# Altium footprint library Molex.PcbLib: 45 footprints (part 1 of 3)
Each footprint in its own frame and in the unit in brackets; x right, y up, seen from the top. Pads: shape width x height; smd on the part's side, far side on the other; paste and mask are expansions set on the pad; w line width, h text height; cw(c..) or ccw(c..) is an arc to the next point about the centre after c.
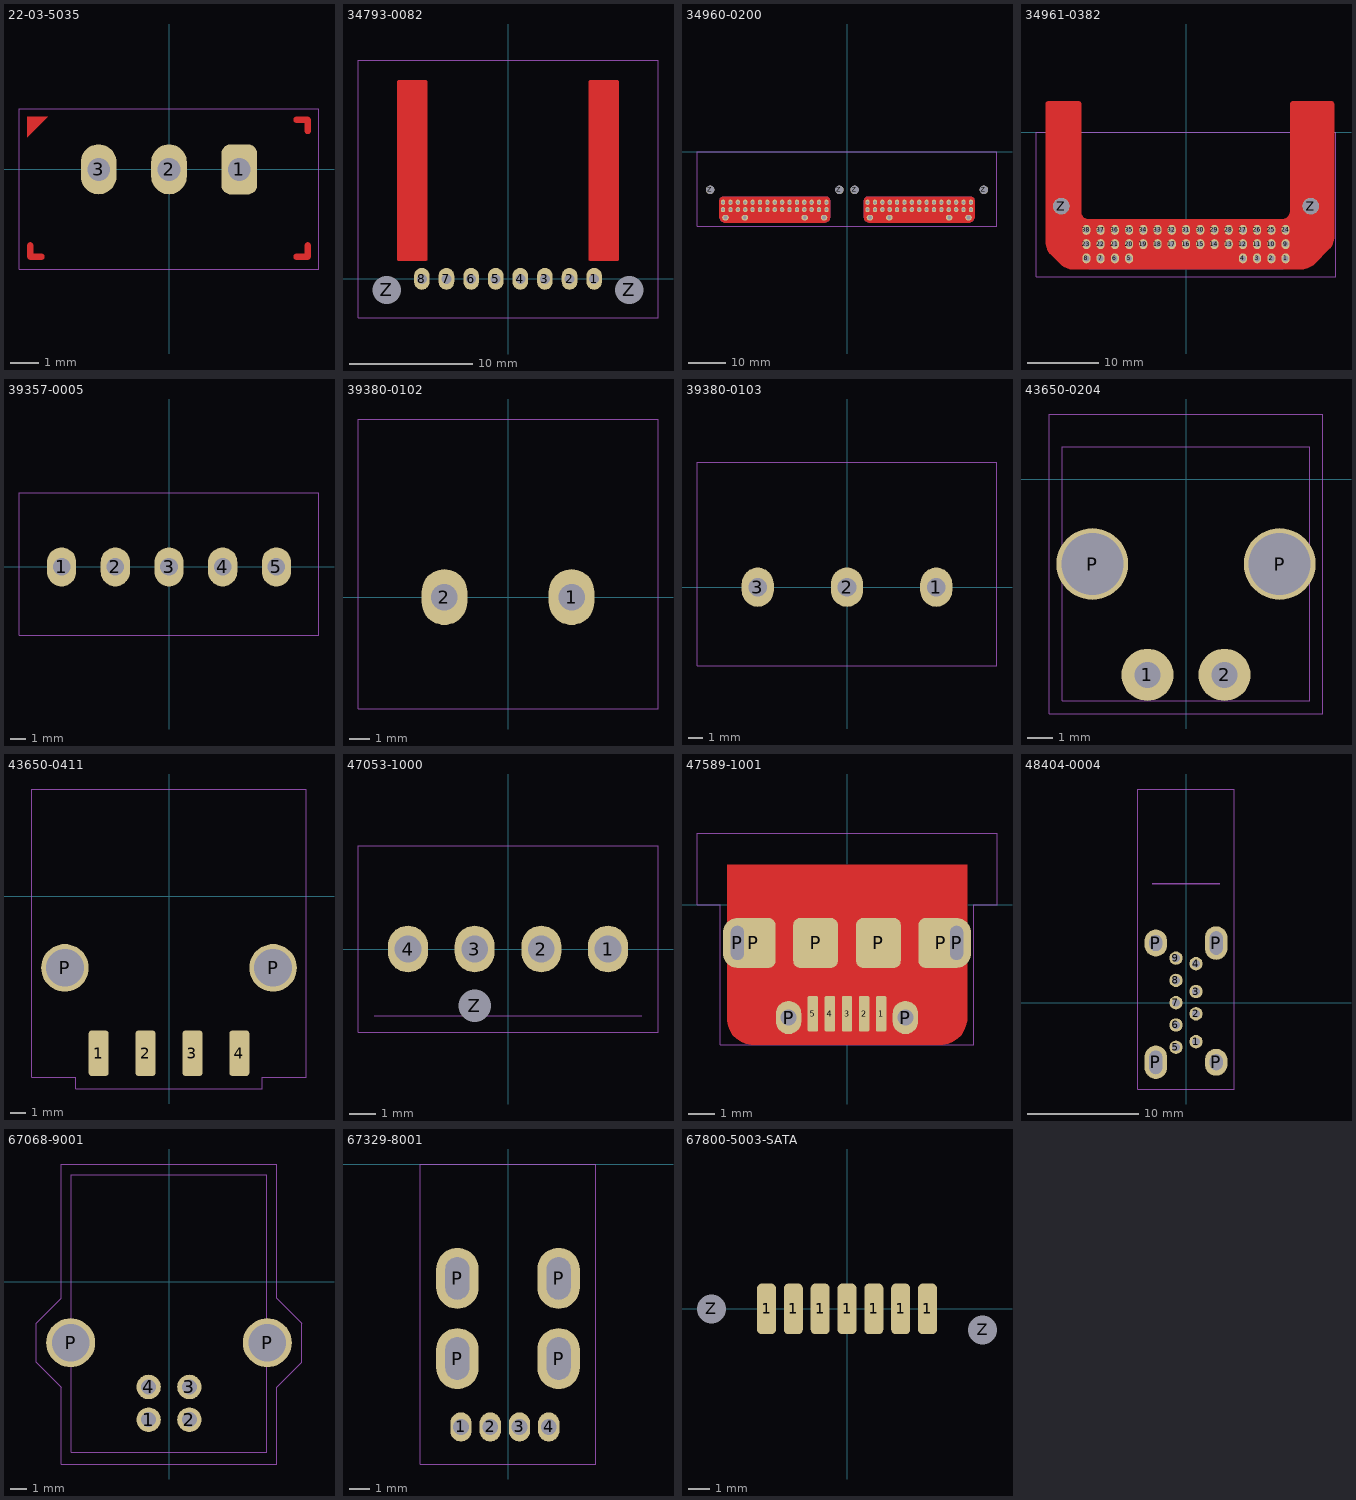
[diagram p0: the footprints below, top view; thin cyan lines are the x and y axes]

## 22-03-5035 [mil] "Mini-SPOX Wire-to-Board Connector"
pads (3):
  rrect50% 50x70 hole 32: 1(98.43,0)
  oval 50x70 hole 32: 2(0,0) 3(-98.43,0)
Top Layer:
  region: 190.36,53.55 190.36,52.76 190.97,51.28 192.09,50.16 193.56,49.55 194.36,49.55 195.15,49.55 196.62,50.16 197.75,51.28 198.36,52.76 198.36,53.55 198.36,69.55 198.36,70.35 197.75,71.82 196.62,72.94 195.15,73.55 194.36,73.55 178.36,73.55 177.56,73.55 176.09,72.94 174.97,71.82 174.36,70.35 174.36,69.55 174.36,68.76 174.97,67.28 176.09,66.16 177.56,65.55 178.36,65.55 188.36,65.55 188.75,65.51 189.47,65.21 190.02,64.66 190.32,63.94 190.36,63.55
  region: 178.36,-118.29 177.56,-118.29 176.09,-118.9 174.97,-120.03 174.36,-121.5 174.36,-122.29 174.36,-123.09 174.97,-124.56 176.09,-125.68 177.56,-126.29 178.36,-126.29 194.36,-126.29 195.15,-126.29 196.62,-125.68 197.75,-124.56 198.36,-123.09 198.36,-122.29 198.36,-106.29 198.36,-105.5 197.75,-104.03 196.62,-102.9 195.15,-102.29 194.36,-102.29 193.56,-102.29 192.09,-102.9 190.97,-104.03 190.36,-105.5 190.36,-106.29 190.36,-116.29 190.32,-116.68 190.02,-117.4 189.47,-117.96 188.75,-118.26 188.36,-118.29
  region: -198.34,73.55 -198.34,45.01 -169.79,73.55
  region: -190.34,-106.29 -190.34,-105.5 -190.95,-104.03 -192.07,-102.9 -193.54,-102.29 -194.34,-102.29 -195.13,-102.29 -196.6,-102.9 -197.73,-104.03 -198.34,-105.5 -198.34,-106.29 -198.34,-122.29 -198.34,-123.09 -197.73,-124.56 -196.6,-125.68 -195.13,-126.29 -194.34,-126.29 -178.34,-126.29 -177.54,-126.29 -176.07,-125.68 -174.95,-124.56 -174.34,-123.09 -174.34,-122.29 -174.34,-121.5 -174.95,-120.03 -176.07,-118.9 -177.54,-118.29 -178.34,-118.29 -188.34,-118.29 -188.73,-118.26 -189.45,-117.96 -190,-117.4 -190.3,-116.68 -190.34,-116.29
Top Component Outline:
  lines w1: -210,-140 -210,85 210,85 210,-140 -210,-140
3D body "MOLEX-22-03-5035.stp": height 232.14, standoff -137.94, extent -194.87,-122.83 194.89,70.09

## 34793-0082 [mil]
pads (10):
  oval 50x70 hole 32: 1(275.59,0) 2(196.85,0) 3(118.11,0) 4(39.37,0) 5(-39.37,0) 6(-118.11,0) 7(-196.85,0) 8(-275.59,0)
  round 85.55 hole 90.55 unplated mask+8: Z(-387.8,-35.43) Z(387.8,-35.43)
Top Layer:
  pour cut-out: 263.39,57.99 350,57.99 350.99,57.99 352.83,58.75 354.24,60.16 355,62 355,62.99 355,629.92 355,630.92 354.24,632.75 352.83,634.16 350.99,634.92 350,634.92 263.39,634.92 262.39,634.92 260.55,634.16 259.15,632.75 258.39,630.92 258.39,629.92 258.39,62.99 258.39,62 259.15,60.16 260.55,58.75 262.39,57.99
  pour cut-out: -350,57.99 -263.39,57.99 -262.39,57.99 -260.55,58.75 -259.15,60.16 -258.39,62 -258.39,62.99 -258.39,629.92 -258.39,630.92 -259.15,632.75 -260.55,634.16 -262.39,634.92 -263.39,634.92 -350,634.92 -350.99,634.92 -352.83,634.16 -354.24,632.75 -355,630.92 -355,629.92 -355,62.99 -355,62 -354.24,60.16 -352.83,58.75 -350.99,57.99
Top Solder:
  region: -263.39,629.92 -350,629.92 -350,62.99 -263.39,62.99
  region: 350,629.92 263.39,629.92 263.39,62.99 350,62.99
Top Component Outline:
  lines w1: -480,-125 480,-125 480,700 -480,700 -480,-125
Top 3D Body (Mech16):
  lines w1: -350,62.99 -263.39,62.99 -263.39,629.92 -350,629.92 -350,62.99 ; 263.39,62.99 350,62.99 350,629.92 263.39,629.92 263.39,62.99
Multi-Layer:
  pour cut-out: 387.8,-95.43 381.89,-95.43 370.29,-93.13 359.37,-88.6 349.55,-82.04 341.19,-73.68 334.62,-63.85 330.1,-52.93 327.8,-41.34 327.8,-35.43 327.8,-29.52 330.1,-17.93 334.62,-7.01 341.19,2.81 349.55,11.17 359.37,17.74 370.29,22.26 381.89,24.57 387.8,24.57 393.7,24.57 405.3,22.26 416.22,17.74 426.04,11.17 434.4,2.81 440.97,-7.01 445.49,-17.93 447.8,-29.52 447.8,-35.43 447.8,-41.34 445.49,-52.93 440.97,-63.85 434.4,-73.68 426.04,-82.04 416.22,-88.6 405.3,-93.13 393.7,-95.43
  pour cut-out: -387.8,-95.43 -381.89,-95.43 -370.29,-93.13 -359.37,-88.6 -349.55,-82.04 -341.19,-73.68 -334.62,-63.85 -330.1,-52.93 -327.8,-41.34 -327.8,-35.43 -327.8,-29.52 -330.1,-17.93 -334.62,-7.01 -341.19,2.81 -349.55,11.17 -359.37,17.74 -370.29,22.26 -381.89,24.57 -387.8,24.57 -393.7,24.57 -405.3,22.26 -416.22,17.74 -426.04,11.17 -434.4,2.81 -440.97,-7.01 -445.49,-17.93 -447.8,-29.52 -447.8,-35.43 -447.8,-41.34 -445.49,-52.93 -440.97,-63.85 -434.4,-73.68 -426.04,-82.04 -416.22,-88.6 -405.3,-93.13 -393.7,-95.43
3D body "347930082.stp": height 411.95, standoff -145.19, extent -445.3,-90.55 445.3,610.24

## 34960-0200 [mil]
pads (72):
  oval 70x60 hole 40: A1(1296.06,-704.72) A2(1089.37,-704.72) A3(451.57,-704.72) A4(244.88,-704.72) B1(-244.88,-704.72) B2(-451.57,-704.72) B3(-1089.37,-704.72) B4(-1296.06,-704.72)
  oval 45x55 hole 32: A5(1321.65,-620.08) A6(1242.91,-620.08) A7(1164.17,-620.08) A8(1085.43,-620.08) A9(1006.69,-620.08) A10(927.95,-620.08) A11(849.21,-620.08) A12(770.47,-620.08) A13(691.73,-620.08) A14(612.99,-620.08) A15(534.25,-620.08) A16(455.51,-620.08) A17(376.77,-620.08) A18(298.03,-620.08) A19(219.29,-620.08) A20(1321.65,-541.34) A21(1242.91,-541.34) A22(1164.17,-541.34) A23(1085.43,-541.34) A24(1006.69,-541.34) A25(927.95,-541.34) A26(849.21,-541.34) A27(770.47,-541.34) A28(691.73,-541.34) A29(612.99,-541.34) A30(534.25,-541.34) A31(455.51,-541.34) A32(376.77,-541.34) A33(298.03,-541.34) A34(219.29,-541.34) B5(-219.29,-620.08) B6(-298.03,-620.08) B7(-376.77,-620.08) B8(-455.51,-620.08) B9(-534.25,-620.08) B10(-612.99,-620.08) B11(-691.73,-620.08) B12(-770.47,-620.08) B13(-849.21,-620.08) B14(-927.95,-620.08) B15(-1006.69,-620.08) B16(-1085.43,-620.08) B17(-1164.17,-620.08) B18(-1242.91,-620.08) B19(-1321.65,-620.08) B20(-219.29,-541.34) B21(-298.03,-541.34) B22(-376.77,-541.34) B23(-455.51,-541.34) B24(-534.25,-541.34) B25(-612.99,-541.34) B26(-691.73,-541.34) B27(-770.47,-541.34) B28(-849.21,-541.34) B29(-927.95,-541.34) B30(-1006.69,-541.34) B31(-1085.43,-541.34) B32(-1164.17,-541.34) B33(-1242.91,-541.34) B34(-1321.65,-541.34)
  round 90 hole 90.55 unplated mask+8: Z(-1460.63,-409.45) Z(-80.31,-409.45) Z(80.31,-409.45) Z(1460.63,-409.45)
Top Layer:
  pour cut-out: -179.92,-521.65 -179.92,-517.78 -181.43,-510.17 -184.4,-503 -188.71,-496.56 -194.19,-491.07 -200.64,-486.76 -207.81,-483.8 -215.41,-482.28 -219.29,-482.28 -1321.65,-482.28 -1325.53,-482.28 -1333.14,-483.8 -1340.3,-486.76 -1346.75,-491.07 -1352.23,-496.56 -1356.54,-503 -1359.51,-510.17 -1361.02,-517.78 -1361.02,-521.65 -1361.02,-698.82 -1361.02,-704.64 -1358.75,-716.04 -1354.3,-726.79 -1347.84,-736.46 -1339.61,-744.69 -1329.94,-751.15 -1319.19,-755.6 -1307.79,-757.87 -1301.97,-757.87 -238.98,-757.87 -233.16,-757.87 -221.75,-755.6 -211,-751.15 -201.33,-744.69 -193.11,-736.46 -186.64,-726.79 -182.19,-716.04 -179.92,-704.64 -179.92,-698.82
  pour cut-out: 1361.02,-521.65 1361.02,-517.78 1359.51,-510.17 1356.54,-503 1352.23,-496.56 1346.75,-491.07 1340.3,-486.76 1333.14,-483.8 1325.53,-482.28 1321.65,-482.28 219.29,-482.28 215.41,-482.28 207.81,-483.8 200.64,-486.76 194.19,-491.07 188.71,-496.56 184.4,-503 181.43,-510.17 179.92,-517.78 179.92,-521.65 179.92,-698.82 179.92,-704.64 182.19,-716.04 186.64,-726.79 193.11,-736.46 201.33,-744.69 211,-751.15 221.75,-755.6 233.16,-757.87 238.98,-757.87 1301.97,-757.87 1307.79,-757.87 1319.19,-755.6 1329.94,-751.15 1339.61,-744.69 1347.84,-736.46 1354.3,-726.79 1358.75,-716.04 1361.02,-704.64 1361.02,-698.82
Bottom Layer:
  pour cut-out: -1361.02,-521.65 -1361.02,-517.78 -1359.51,-510.17 -1356.54,-503 -1352.23,-496.56 -1346.75,-491.07 -1340.3,-486.76 -1333.14,-483.8 -1325.53,-482.28 -1321.65,-482.28 -219.29,-482.28 -215.41,-482.28 -207.81,-483.8 -200.64,-486.76 -194.19,-491.07 -188.71,-496.56 -184.4,-503 -181.43,-510.17 -179.92,-517.78 -179.92,-521.65 -179.92,-698.82 -179.92,-704.64 -182.19,-716.04 -186.64,-726.79 -193.11,-736.46 -201.33,-744.69 -211,-751.15 -221.75,-755.6 -233.16,-757.87 -238.98,-757.87 -1301.97,-757.87 -1307.79,-757.87 -1319.19,-755.6 -1329.94,-751.15 -1339.61,-744.69 -1347.84,-736.46 -1354.3,-726.79 -1358.75,-716.04 -1361.02,-704.64 -1361.02,-698.82
  pour cut-out: 179.92,-521.65 179.92,-517.78 181.43,-510.17 184.4,-503 188.71,-496.56 194.19,-491.07 200.64,-486.76 207.81,-483.8 215.41,-482.28 219.29,-482.28 1321.65,-482.28 1325.53,-482.28 1333.14,-483.8 1340.3,-486.76 1346.75,-491.07 1352.23,-496.56 1356.54,-503 1359.51,-510.17 1361.02,-517.78 1361.02,-521.65 1361.02,-698.82 1361.02,-704.64 1358.75,-716.04 1354.3,-726.79 1347.84,-736.46 1339.61,-744.69 1329.94,-751.15 1319.19,-755.6 1307.79,-757.87 1301.97,-757.87 238.98,-757.87 233.16,-757.87 221.75,-755.6 211,-751.15 201.33,-744.69 193.11,-736.46 186.64,-726.79 182.19,-716.04 179.92,-704.64 179.92,-698.82
Top Component Outline:
  lines w1: -1600,-800 -1600,0 1600,0 1600,-800 -1600,-800
Top 3D Body (Mech16):
  lines w1: -1563.95,0 1563.95,0
Multi-Layer:
  pour cut-out: -1460.63,-469.45 -1466.54,-469.45 -1478.13,-467.14 -1489.05,-462.62 -1498.88,-456.05 -1507.23,-447.7 -1513.8,-437.87 -1518.32,-426.95 -1520.63,-415.36 -1520.63,-409.45 -1520.63,-403.54 -1518.32,-391.95 -1513.8,-381.03 -1507.23,-371.2 -1498.88,-362.84 -1489.05,-356.28 -1478.13,-351.75 -1466.54,-349.45 -1460.63,-349.45 -1454.72,-349.45 -1443.13,-351.75 -1432.21,-356.28 -1422.38,-362.84 -1414.02,-371.2 -1407.46,-381.03 -1402.94,-391.95 -1400.63,-403.54 -1400.63,-409.45 -1400.63,-415.36 -1402.94,-426.95 -1407.46,-437.87 -1414.02,-447.7 -1422.38,-456.05 -1432.21,-462.62 -1443.13,-467.14 -1454.72,-469.45
  pour cut-out: -80.31,-469.45 -86.22,-469.45 -97.82,-467.14 -108.74,-462.62 -118.56,-456.05 -126.92,-447.7 -133.49,-437.87 -138.01,-426.95 -140.31,-415.36 -140.31,-409.45 -140.31,-403.54 -138.01,-391.95 -133.49,-381.03 -126.92,-371.2 -118.56,-362.84 -108.74,-356.28 -97.82,-351.75 -86.22,-349.45 -80.31,-349.45 -74.41,-349.45 -62.81,-351.75 -51.89,-356.28 -42.07,-362.84 -33.71,-371.2 -27.14,-381.03 -22.62,-391.95 -20.31,-403.54 -20.31,-409.45 -20.31,-415.36 -22.62,-426.95 -27.14,-437.87 -33.71,-447.7 -42.07,-456.05 -51.89,-462.62 -62.81,-467.14 -74.41,-469.45
  pour cut-out: 80.31,-469.45 74.41,-469.45 62.81,-467.14 51.89,-462.62 42.07,-456.05 33.71,-447.7 27.14,-437.87 22.62,-426.95 20.32,-415.36 20.32,-409.45 20.32,-403.54 22.62,-391.95 27.14,-381.03 33.71,-371.2 42.07,-362.84 51.89,-356.28 62.81,-351.75 74.41,-349.45 80.31,-349.45 86.22,-349.45 97.82,-351.75 108.74,-356.28 118.56,-362.84 126.92,-371.2 133.49,-381.03 138.01,-391.95 140.31,-403.54 140.31,-409.45 140.31,-415.36 138.01,-426.95 133.49,-437.87 126.92,-447.7 118.56,-456.05 108.74,-462.62 97.82,-467.14 86.22,-469.45
  pour cut-out: 1460.63,-469.45 1466.54,-469.45 1478.13,-467.14 1489.05,-462.62 1498.88,-456.05 1507.23,-447.7 1513.8,-437.87 1518.32,-426.95 1520.63,-415.36 1520.63,-409.45 1520.63,-403.54 1518.32,-391.95 1513.8,-381.03 1507.23,-371.2 1498.88,-362.84 1489.05,-356.28 1478.13,-351.75 1466.54,-349.45 1460.63,-349.45 1454.72,-349.45 1443.13,-351.75 1432.21,-356.28 1422.38,-362.84 1414.02,-371.2 1407.46,-381.03 1402.94,-391.95 1400.63,-403.54 1400.63,-409.45 1400.63,-415.36 1402.94,-426.95 1407.46,-437.87 1414.02,-447.7 1422.38,-456.05 1432.21,-462.62 1443.13,-467.14 1454.72,-469.45
3D body "MOLEX-34960-0200.stp": height 658.02, standoff -146.32, extent -1563.94,-763.95 1563.95,157.48

## 34961-0382 [mil]
pads (40):
  oval 45x55 hole 32: 1(551.18,-698.82) 2(472.44,-698.82) 3(393.7,-698.82) 4(314.96,-698.82) 5(-314.96,-698.82) 6(-393.7,-698.82) 7(-472.44,-698.82) 8(-551.18,-698.82) 9(551.18,-620.08) 10(472.44,-620.08) 11(393.7,-620.08) 12(314.96,-620.08) 13(236.22,-620.08) 14(157.48,-620.08) 15(78.74,-620.08) 16(0,-620.08) 17(-78.74,-620.08) 18(-157.48,-620.08) 19(-236.22,-620.08) 20(-314.96,-620.08) 21(-393.7,-620.08) 22(-472.44,-620.08) 23(-551.18,-620.08) 24(551.18,-541.34) 25(472.44,-541.34) 26(393.7,-541.34) 27(314.96,-541.34) 28(236.22,-541.34) 29(157.48,-541.34) 30(78.74,-541.34) 31(0,-541.34) 32(-78.74,-541.34) 33(-157.48,-541.34) 34(-236.22,-541.34) 35(-314.96,-541.34) 36(-393.7,-541.34) 37(-472.44,-541.34) 38(-551.18,-541.34)
  round 90 hole 90.55 unplated mask+8: Z(-690.16,-409.45) Z(690.16,-409.45)
Top Layer:
  pour cut-out: 530,-482.28 534.52,-482.06 543.4,-480.3 551.76,-476.83 559.28,-471.81 565.68,-465.41 570.71,-457.88 574.17,-449.52 575.93,-440.65 576.16,-436.13 576.16,155.61 576.16,158.47 578.35,163.76 582.4,167.81 587.69,170 590.55,170 805,170 807.98,170 813.5,167.72 817.72,163.5 820,157.98 820,155 820,-578.74 820,-588.59 816.16,-607.91 808.62,-626.1 797.67,-642.48 790.71,-649.45 711.57,-728.58 704.61,-735.55 688.23,-746.49 670.03,-754.03 650.71,-757.87 640.86,-757.87 -634.2,-757.87 -642.03,-757.87 -657.39,-754.82 -671.85,-748.83 -684.87,-740.13 -690.41,-734.59 -745.71,-679.29 -752.68,-672.32 -763.62,-655.95 -771.16,-637.75 -775,-618.43 -775,-608.58 -775,158.7 -775,160.95 -773.28,165.1 -770.1,168.28 -765.95,170 -763.7,170 -592.52,170 -590.03,170 -585.43,168.09 -581.91,164.57 -580,159.97 -580,157.48 -580,-442.28 -579.81,-446.2 -578.28,-453.89 -575.28,-461.14 -570.92,-467.66 -565.38,-473.2 -558.86,-477.56 -551.61,-480.56 -543.92,-482.09 -540,-482.28
  pour cut-out: 551.18,-482.28
Bottom Layer:
  pour cut-out: -590.55,-521.65 -590.55,-517.78 -589.04,-510.17 -586.07,-503 -581.76,-496.56 -576.28,-491.07 -569.83,-486.76 -562.66,-483.8 -555.06,-482.28 -551.18,-482.28 551.18,-482.28 555.06,-482.28 562.66,-483.8 569.83,-486.76 576.28,-491.07 581.76,-496.56 586.07,-503 589.04,-510.17 590.55,-517.78 590.55,-521.65 590.55,-698.82 590.55,-704.64 588.28,-716.04 583.83,-726.79 577.37,-736.46 569.14,-744.69 559.47,-751.15 548.72,-755.6 537.31,-757.87 531.5,-757.87 -531.5,-757.87 -537.31,-757.87 -548.72,-755.6 -559.47,-751.15 -569.14,-744.69 -577.37,-736.46 -583.83,-726.79 -588.28,-716.04 -590.55,-704.64 -590.55,-698.82
Top Solder:
  region: 595,150 595,-720 643.58,-720 653.43,-720 672.75,-716.16 690.95,-708.62 707.32,-697.68 714.29,-690.71 770.71,-634.29 777.67,-627.32 788.62,-610.95 796.16,-592.75 800,-573.43 800,-563.58 800,150
  pour cut-out: 800,150
  region: -595,150 -760,150 -760,-603.58 -760,-613.43 -756.16,-632.75 -748.62,-650.95 -737.68,-667.32 -730.71,-674.29 -714.29,-690.71 -707.32,-697.68 -690.95,-708.62 -672.75,-716.16 -653.43,-720 -643.58,-720 -595,-720
Top Component Outline:
  pour cut-out: 780,-679.13
  lines w1: 829.53,0 -830,0 -830,-800 830,-800 830,0
Multi-Layer:
  pour cut-out: -690.16,-469.45 -696.07,-469.45 -707.66,-467.14 -718.58,-462.62 -728.41,-456.05 -736.76,-447.7 -743.33,-437.87 -747.85,-426.95 -750.16,-415.36 -750.16,-409.45 -750.16,-403.54 -747.85,-391.95 -743.33,-381.03 -736.76,-371.2 -728.41,-362.84 -718.58,-356.28 -707.66,-351.75 -696.07,-349.45 -690.16,-349.45 -684.25,-349.45 -672.66,-351.75 -661.74,-356.28 -651.91,-362.84 -643.55,-371.2 -636.99,-381.03 -632.46,-391.95 -630.16,-403.54 -630.16,-409.45 -630.16,-415.36 -632.46,-426.95 -636.99,-437.87 -643.55,-447.7 -651.91,-456.05 -661.74,-462.62 -672.66,-467.14 -684.25,-469.45
  pour cut-out: 690.16,-469.45 696.07,-469.45 707.66,-467.14 718.58,-462.62 728.41,-456.05 736.76,-447.7 743.33,-437.87 747.85,-426.95 750.16,-415.36 750.16,-409.45 750.16,-403.54 747.85,-391.95 743.33,-381.03 736.76,-371.2 728.41,-362.84 718.58,-356.28 707.66,-351.75 696.07,-349.45 690.16,-349.45 684.25,-349.45 672.66,-351.75 661.74,-356.28 651.91,-362.84 643.55,-371.2 636.99,-381.03 632.46,-391.95 630.16,-403.54 630.16,-409.45 630.16,-415.36 632.46,-426.95 636.99,-437.87 643.55,-447.7 651.91,-456.05 661.74,-462.62 672.66,-467.14 684.25,-469.45
3D body "MOLEX-34961-0382.stp": height 1143.71, standoff -614.92, extent -1016.71,-764 997.76,157.46

## 39357-0005 [mil]
pads (5):
  oval 75x100 hole 45: 1(-275.59,0) 2(-137.8,0) 3(0,0) 4(137.8,0) 5(275.59,0)
Top Component Outline:
  lines w1: -385,-175 385,-175 385,190 -385,190 -385,-175
3D body "MOLEX-39357-0005.stp": height 335, standoff -138, extent -344.99,-136 345,151

## 39380-0102 [mil]
pads (2):
  oval 90x110 hole 52: 1(125,0) 2(-125,0)
Top Component Outline:
  lines w1: -295,-220 -295,350 295,350 295,-220 -295,-220
3D body "MOLEX-39380-0102.stp": height 846, standoff -217, extent -274.01,-181 249.99,311

## 39380-0103 [mil]
pads (3):
  oval 90x110 hole 52: 1(250,0) 2(0,0) 3(-250,0)
Top Component Outline:
  lines w1: -420,-220 -420,350 420,350 420,-220 -420,-220
3D body "MOLEX-39380-0103.stp": height 846, standoff -217, extent -399.01,-181 374.99,311

## 43650-0204 [mil] "DC POWER JACK"
pads (4):
  round 80 hole 40: 1(-59.05,-300) 2(59.06,-300)
  round 110 hole 95: P(-143.7,-130) P(143.7,-130)
Top Component Outline:
  lines w1: -210,-360 -210,100 210,100 210,-360 -210,-360
Top 3D Body (Mech16):
  lines w1: -189.96,-339.77 189.96,-339.77 189.96,50 -189.96,50 -189.96,-339.77
3D body "436500204.stp": height 218.43, standoff -127.44, extent -189.96,-339.77 189.96,50

## 43650-0411 [mil]
pads (6):
  rrect30% 50x115 smd paste+0 mask+2: 1(-177.17,-395) 2(-59.05,-395) 3(59.06,-395) 4(177.17,-395)
  round 120 hole 95: P(-262,-180) P(262,-180)
Top Component Outline:
  lines w1: -345,-455 -345,270 345,270 345,-455 235,-455 235,-485 -235,-485 -235,-455 -345,-455
3D body "MOLEX-43650-0411.stp": height 223.43, standoff -75.98, extent -308.07,-421.84 308.07,1

## 47053-1000 [mm]
pads (5):
  oval 1.524x1.778 hole 1.02: 1(3.81,0) 2(1.27,0) 3(-1.27,0) 4(-3.81,0)
  round 1 hole 1.25 unplated: Z(-1.27,-2.16)
Top Component Outline:
  lines w0.025: -5.715,-3.175 5.715,-3.175 5.715,3.937 -5.715,3.937 -5.715,-3.175
Top 3D Body (Mech16):
  lines w0.025: -5.1,-2.54 5.1,-2.54
3D body "MOLEX-47053-1000.stp": height 10.04, standoff -3.46, extent -5.1,-2.54 5.1,3.3

## 47589-1001 [mm] "REC TYPE AB ASSY MICRO USB"
pads (13):
  rrect30% 0.4x1.35 smd: 1(1.3,-4.15) 2(0.65,-4.15) 3(0,-4.15) 4(-0.65,-4.15) 5(-1.3,-4.15)
  oval 1.1x1.9 hole 0.5 slot 1.3 at 90 deg: P(-4.175,-1.45) P(4.175,-1.45)
  rrect30% 1.7x1.9 smd paste+0: P(-3.575,-1.45)
  oval 0.965x1.27 hole 0.61: P(-2.222,-4.293) P(2.222,-4.293)
  rrect30% 1.7x1.9 smd: P(-1.2,-1.45) P(1.2,-1.45) P(3.575,-1.45)
Top Layer:
  pour cut-out: -4.572,1.524 -4.572,-4.318 -4.572,-4.418 -4.533,-4.614 -4.456,-4.799 -4.345,-4.966 -4.204,-5.107 -4.037,-5.218 -3.852,-5.295 -3.656,-5.334 -3.556,-5.334 3.556,-5.334 3.656,-5.334 3.852,-5.295 4.037,-5.218 4.204,-5.107 4.345,-4.966 4.456,-4.799 4.533,-4.614 4.572,-4.418 4.572,-4.318 4.572,1.524
Top Paste:
  region: 2.222,-3.658 2.298,-3.658 2.438,-3.716 2.545,-3.823 2.603,-3.963 2.603,-4.039 2.603,-4.547 2.603,-4.622 2.545,-4.762 2.438,-4.87 2.298,-4.928 2.222,-4.928 2.147,-4.928 2.007,-4.87 1.9,-4.762 1.842,-4.622 1.842,-4.547 1.842,-4.039 1.842,-3.963 1.9,-3.823 2.007,-3.716 2.147,-3.658
  region: -2.223,-3.658 -2.147,-3.658 -2.007,-3.716 -1.9,-3.823 -1.842,-3.963 -1.842,-4.039 -1.842,-4.547 -1.842,-4.622 -1.9,-4.762 -2.007,-4.87 -2.147,-4.928 -2.223,-4.928 -2.298,-4.928 -2.438,-4.87 -2.545,-4.762 -2.603,-4.622 -2.603,-4.547 -2.603,-4.039 -2.603,-3.963 -2.545,-3.823 -2.438,-3.716 -2.298,-3.658
  region: -4.175,-0.51 -4.281,-0.51 -4.477,-0.591 -4.627,-0.741 -4.708,-0.937 -4.708,-1.044 -4.708,-1.856 -4.708,-1.962 -4.627,-2.159 -4.477,-2.309 -4.281,-2.39 -4.175,-2.39 -4.069,-2.39 -3.873,-2.309 -3.723,-2.159 -3.642,-1.962 -3.642,-1.856 -3.642,-1.044 -3.642,-0.937 -3.723,-0.741 -3.873,-0.591 -4.069,-0.51
  region: 4.175,-0.51 4.069,-0.51 3.873,-0.591 3.723,-0.741 3.642,-0.937 3.642,-1.044 3.642,-1.856 3.642,-1.962 3.723,-2.159 3.873,-2.309 4.069,-2.39 4.175,-2.39 4.281,-2.39 4.477,-2.309 4.627,-2.159 4.708,-1.962 4.708,-1.856 4.708,-1.044 4.708,-0.937 4.627,-0.741 4.477,-0.591 4.281,-0.51
Top Component Outline:
  lines w0.025: -5.715,0 -5.715,2.732 5.715,2.732 5.715,0 4.826,0 4.826,-5.334 -4.826,-5.334 -4.826,0 -5.715,0
3D body "475891001.stp": height 2.72, standoff -0.62, extent -4.325,-4.496 4.325,1.299

## 48404-0004 [mm] "CONN RCPT USB 3.0 A UPRIGHT PCB"
pads (13):
  round 1.2 hole 0.7: 1(0.9,-3.5) 2(0.9,-1) 3(0.9,1) 4(0.9,3.5) 5(-0.9,-4) 6(-0.9,-2) 7(-0.9,0) 8(-0.9,2) 9(-0.9,4)
  oval 2.032x2.997 hole 1.143 slot 2.108 at 90 deg: P(-2.71,-5.35) P(2.71,5.35)
  oval 2.032x2.413 hole 1.143 slot 1.422 at 90 deg: P(-2.71,5.35) P(2.71,-5.35)
Top Component Outline:
  lines w0.025: -4.318,-7.747 -4.318,19.177 4.318,19.177 4.318,-7.747 -4.318,-7.747
Top 3D Body (Mech16):
  lines w0.127: -3.048,10.676 3.048,10.676
3D body "484040004.stp": height 14.64, standoff -3.56, extent -3.66,-7.142 3.66,18.558

## 67068-9001 [mm]
pads (6):
  round 1.5 hole 0.92: 1(-1.25,-8.46) 2(1.25,-8.46) 3(1.25,-6.46) 4(-1.25,-6.46)
  round 3 hole 2.3: P(-6.02,-3.75) P(6.02,-3.75)
Top Component Outline:
  lines w0.025: -8.128,-4.953 -6.604,-6.477 -6.604,-11.176 6.604,-11.176 6.604,-6.477 8.128,-4.953 8.128,-2.547 6.604,-1.023 6.604,7.196 -6.604,7.196 -6.604,-1.023 -8.128,-2.547 -8.128,-4.953
Top 3D Body (Mech16):
  lines w0.025: -6,-10.45 -6,6.55 6,6.55 6,-10.45 -6,-10.45
3D body "670689001.stp": height 12.05, standoff -3.17, extent -7.43,-10.45 7.43,6.55

## 67329-8001 [mil] "CONN RCPT USB 4POS UPRIGHT PCB"
pads (8):
  oval 40x55 hole 30: 1(-88.58,-495.28) 2(-33.46,-495.28) 3(21.65,-495.28) 4(76.77,-495.28)
  oval 80x115 hole 45 slot 80 at 90 deg: P(-95.28,-366.54) P(-95.28,-215.35) P(95.28,-366.54) P(95.28,-215.35)
Top Component Outline:
  lines w1: -165,-565 165,-565 165,0 -165,0 -165,-565
3D body "673298001.stp": height 570.32, standoff -133.23, extent -137.7,-538.58 137.89,0

## 67800-5003-SATA [mm]
pads (9):
  rrect50% 0.9x2.4 smd mask+0.051: 1(-3.81,0) 1(-2.54,0) 1(-1.27,0) 1(0,0) 1(1.27,0) 1(2.54,0) 1(3.81,0)
  round 1 hole 1.372 unplated mask+0.254: Z(-6.415,0) Z(6.415,-1)
3D body "678005003.stp": height 8.38, standoff -2.67, extent -8.577,-4.037 8.323,2.413

## 67910-0002-NGFF-M2 [mm]
3D body "67910-0002.step": height 4, standoff -0.6, extent -14.365,-0.421 15.635,9.779